# Altium footprint library ArduinoMegaShield.PcbLib: 1 footprints
Each footprint in its own frame and in the unit in brackets; x right, y up, seen from the top. Pads: shape width x height; smd on the part's side, far side on the other; paste and mask are expansions set on the pad; w line width, h text height; cw(c..) or ccw(c..) is an arc to the next point about the centre after c.
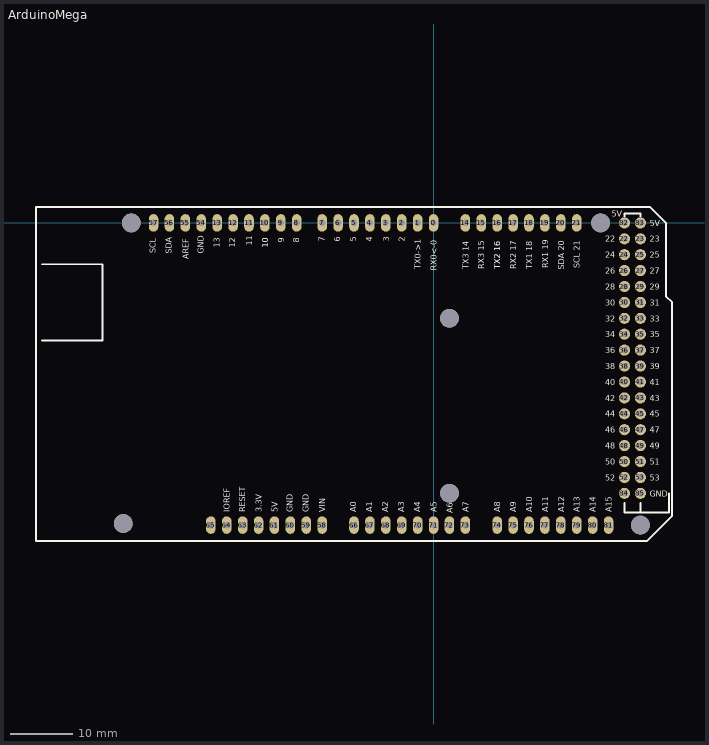
[diagram p0: the footprint, top view; thin cyan lines are the x and y axes]

## ArduinoMega [mil] "Arduino Mega Shield"
pads (92):
  oval 60x110 hole 40: 0(0,0) 1(-100,0) 2(-200,0) 3(-300,0) 4(-400,0) 5(-500,0) 6(-600,0) 7(-700,0) 8(-860,0) 9(-960,0) 10(-1060,0) 11(-1160,0) 12(-1260,0) 13(-1360,0) 14(200,0) 15(300,0) 16(400,0) 17(500,0) 18(600,0) 19(700,0) 20(800,0) 21(900,0) 54(-1460,0) 55(-1560,0) 56(-1660,0) 57(-1760,0) 58(-700,-1900) 59(-800,-1900) 60(-900,-1900) 61(-1000,-1900) 62(-1100,-1900) 63(-1200,-1900) 64(-1300,-1900) 65(-1400,-1900) 66(-500,-1900) 67(-400,-1900) 68(-300,-1900) 69(-200,-1900) 70(-100,-1900) 71(0,-1900) 72(100,-1900) 73(200,-1900) 74(400,-1900) 75(500,-1900) 76(600,-1900) 77(700,-1900) 78(800,-1900) 79(900,-1900) 80(1000,-1900) 81(1100,-1900)
  round 70 hole 40: 22(1200,-100) 23(1300,-100) 24(1200,-200) 25(1300,-200) 26(1200,-300) 27(1300,-300) 28(1200,-400) 29(1300,-400) 30(1200,-500) 31(1300,-500) 32(1200,-600) 33(1300,-600) 34(1200,-700) 35(1300,-700) 36(1200,-800) 37(1300,-800) 38(1200,-900) 39(1300,-900) 40(1200,-1000) 41(1300,-1000) 42(1200,-1100) 43(1300,-1100) 44(1200,-1200) 45(1300,-1200) 46(1200,-1300) 47(1300,-1300) 48(1200,-1400) 49(1300,-1400) 50(1200,-1500) 51(1300,-1500) 52(1200,-1600) 53(1300,-1600) 82(1200,0) 83(1300,0) 84(1200,-1700) 85(1300,-1700)
  round 118.11 hole 118.11 unplated: ""(-1950,-1890) ""(-1900,0) ""(100,-1700) ""(100,-600) ""(1050,0) ""(1300,-1900)
Top Overlay:
  lines w12: -2460,-740 -2080,-740 -2080,-260 -2460,-260 ; 1200,-1760 1200,-1820 1480,-1820 1480,-1700 ; 1200,40 1200,60 1300,60 1300,40 ; 1300,-1820 1300,-1760 ; -2500,-2000 40,-2000 1340,-2000 1500,-1840 1500,-500 1460,-460 1460,0 1360,100 60,100 -2500,100 -2500,-2000
  text "5V" at 1120,40 h36
  text "5V" at 1360,-20 h36
  text "GND" at 1360,-1720 h36
  text "53" at 1360,-1620 h36
  text "51" at 1360,-1520 h36
  text "49" at 1360,-1420 h36
  text "47" at 1360,-1320 h36
  text "45" at 1360,-1220 h36
  text "43" at 1360,-1120 h36
  text "41" at 1360,-1020 h36
  text "39" at 1360,-920 h36
  text "37" at 1360,-820 h36
  text "35" at 1360,-720 h36
  text "33" at 1360,-620 h36
  text "31" at 1360,-520 h36
  text "29" at 1360,-420 h36
  text "27" at 1360,-320 h36
  text "25" at 1360,-220 h36
  text "52" at 1080,-1620 h36
  text "50" at 1080,-1520 h36
  text "48" at 1080,-1420 h36
  text "46" at 1080,-1320 h36
  text "44" at 1080,-1220 h36
  text "42" at 1080,-1120 h36
  text "40" at 1080,-1020 h36
  text "38" at 1080,-920 h36
  text "36" at 1080,-820 h36
  text "34" at 1080,-720 h36
  text "32" at 1080,-620 h36
  text "30" at 1080,-520 h36
  text "28" at 1080,-420 h36
  text "26" at 1080,-320 h36
  text "24" at 1080,-220 h36
  text "22" at 1080,-120 h36
  text "23" at 1360,-120 h36
  text "IOREF" at -1280,-1820 h36
  text "RESET" at -1185,-1820 h36
  text "3.3V" at -1080,-1820 h36
  text "5V" at -980,-1820 h36
  text "GND" at -885,-1820 h36
  text "GND" at -785,-1820 h36
  text "VIN" at -680,-1820 h36
  text "A0" at -485,-1820 h36
  text "A1" at -385,-1820 h36
  text "A2" at -285,-1820 h36
  text "A3" at -185,-1820 h36
  text "A4" at -85,-1820 h36
  text "A5" at 20,-1820 h36
  text "SCL" at -1745,-190 h36
  text "SDA" at -1645,-195 h36
  text "AREF" at -1540,-230 h36
  text "GND" at -1445,-195 h36
  text "13" at -1345,-155 h36
  text "12" at -1245,-155 h36
  text "11" at -1140,-145 h36
  text "10" at -1040,-155 h36
  text "10" at -1040,-155 h36
  text "9" at -940,-125 h36
  text "8" at -845,-125 h36
  text "7" at -685,-120 h36
  text "6" at -585,-120 h36
  text "5" at -485,-120 h36
  text "4" at -385,-120 h36
  text "3" at -280,-120 h36
  text "2" at -180,-120 h36
  text "TX0->1" at -80,-290 h36
  text "RX0<-0" at 20,-300 h36
  text "TX3 14" at 220,-290 h36
  text "RX3 15" at 320,-290 h36
  text "TX2 16" at 420,-290 h36
  text "TX2 16" at 420,-290 h36
  text "RX2 17" at 520,-290 h36
  text "TX1 18" at 620,-290 h36
  text "RX1 19" at 720,-285 h36
  text "SDA 20" at 820,-295 h36
  text "SCL 21" at 920,-285 h36
  text "A6" at 120,-1825 h36
  text "A7" at 220,-1820 h36
  text "A8" at 420,-1820 h36
  text "A9" at 520,-1820 h36
  text "A10" at 620,-1820 h36
  text "A11" at 720,-1820 h36
  text "A12" at 820,-1820 h36
  text "A13" at 920,-1820 h36
  text "A14" at 1020,-1820 h36
  text "A15" at 1120,-1820 h36
3D body "ArduinoMegaShield.STEP": height -29.13, standoff -668.11, extent -2741.98,-1996.61 1510,90